# Altium footprint library 元件1.PcbLib: 420 footprints (part 12 of 27)
Each footprint in its own frame and in the unit in brackets; x right, y up, seen from the top. Pads: shape width x height; smd on the part's side, far side on the other; paste and mask are expansions set on the pad; w line width, h text height; cw(c..) or ccw(c..) is an arc to the next point about the centre after c.
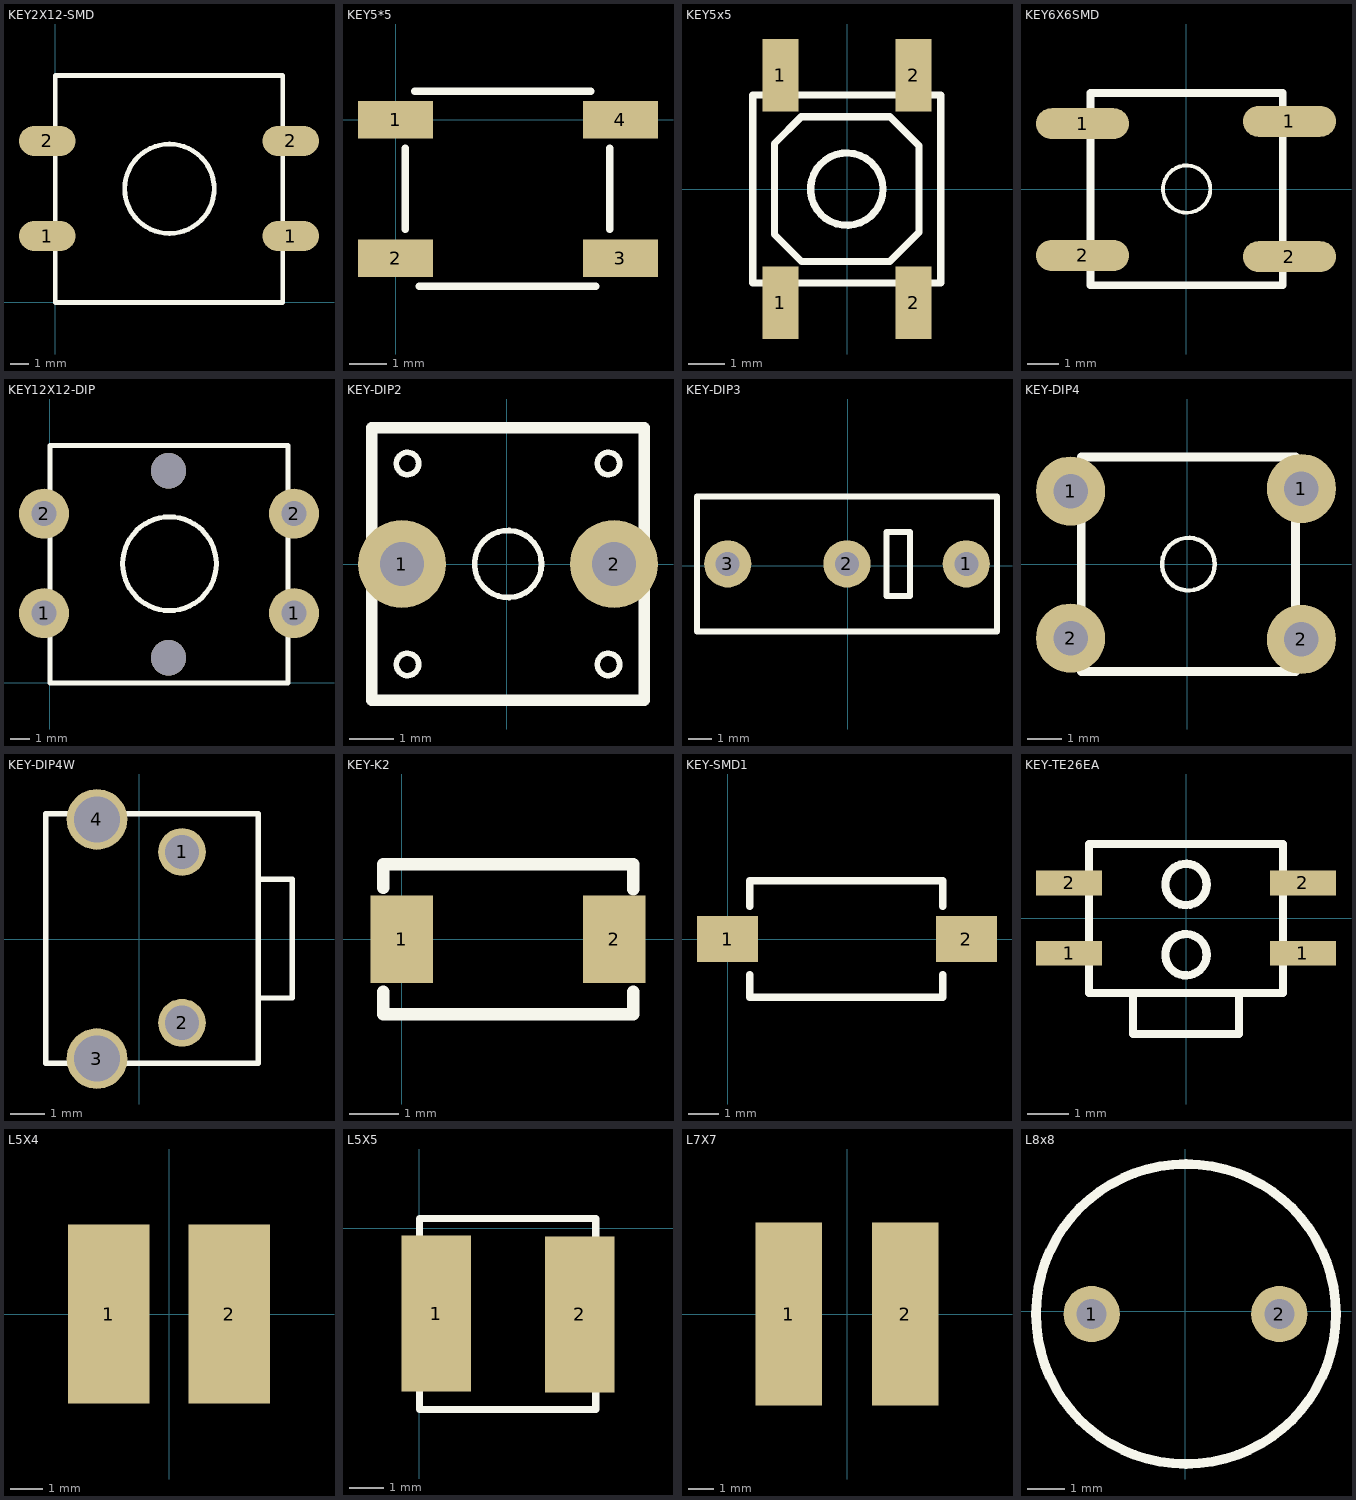
[diagram p11: the footprints below, top view; thin cyan lines are the x and y axes]

## KEY2X12-SMD [mm]
pads (4):
  oval 3x1.6 smd: 1(-0.43,3.532) 1(12.524,3.532) 2(-0.43,8.588) 2(12.524,8.588)
Top Overlay:
  circle w0.254: c6.071,6.045 r2.378
  lines w0.254: 0,0 12.09,0 12.09,12.065 0,12.065 0,0
3D body "User Library-SWT_12x12_SMD.step": height 4, standoff 0, extent -0.629,0.065 12.821,12.065

## KEY5*5 [mm]
pads (4):
  rect 2x1 smd: 1(0,0) 2(0,-3.7) 3(6,-3.7) 4(6,0)
Top Overlay:
  lines w0.2: 0.254,-2.921 0.254,-0.762 ; 0.508,0.762 5.207,0.762 ; 0.635,-4.445 5.334,-4.445 ; 5.715,-2.921 5.715,-0.762
3D body "User Library-IT-1187.STEP": height 1.5, standoff 0, extent -0.254,-4.454 6.146,0.746

## KEY5x5 [mm]
pads (4):
  rect 1x2 smd: 1(-1.841,-3.15) 1(-1.841,3.15) 2(1.841,-3.15) 2(1.841,3.15)
Top Overlay:
  circle w0.2: c-0.007,-0.003 r1
  lines w0.2: -2.607,-2.603 2.593,-2.603 2.593,2.597 -2.607,2.597 -2.607,-2.603 ; -2.007,-1.257 -2.007,1.257 -1.267,1.997 1.19,1.997 1.993,1.194 1.993,-1.194 1.185,-2.003 -1.261,-2.003 -2.007,-1.257
3D body: height 2.5, standoff 1.2, extent -0.992,-0.998 1,0.998
3D body: height 1.2, standoff 0, extent -2.6,-2.6 2.6,2.6

## KEY6X6SMD [mm]
pads (4):
  oval 3x1 smd: 1(-3.336,2.107) 1(3.336,2.181) 2(-3.336,-2.142) 2(3.336,-2.181)
Top Overlay:
  circle w0.127: c0.02,-0.005 r0.762
  lines w0.254: -3.079,-3.104 -3.079,3.094 3.119,3.094 3.119,-3.104 -3.079,-3.104
3D body "TACT SMD 6X6.step": height 5, standoff -0.05, extent -4.024,-3.025 4.126,2.975

## KEY12X12-DIP [mm]
pads (4):
  round 2.54 hole 1.27: 1(-0.303,3.532) 1(12.397,3.532) 2(-0.303,8.588) 2(12.397,8.588)
via 6.02,1.27 diameter 1.8 hole 1.8
via 6.02,10.77 diameter 1.8 hole 1.8
Top Overlay:
  circle w0.254: c6.071,6.045 r2.378
  lines w0.254: 0,0 0,12.065 12.09,12.065 12.09,0 0,0
3D body "SWT9-1.step": height 7.3, standoff -3.5, extent -0.455,0 12.545,12

## KEY-DIP2 [mm] "6X6"
pads (2):
  round 2 hole 1: 1(-2.379,0.004) 2(2.447,0.004)
Top Overlay:
  circle w0.127: c-2.252,-2.282 r0.254
  circle w0.127: c2.32,-2.282 r0.254
  circle w0.127: c2.32,2.29 r0.254
  circle w0.127: c-2.252,2.29 r0.254
  circle w0.127: c0.034,0.004 r0.762
  lines w0.254: -3.065,-3.095 -3.065,3.103 3.133,3.103 3.133,-3.095 -3.065,-3.095
3D body "SW6X6.stp": height 4.3, standoff -14, extent -2.949,-3.097 3.051,3.103

## KEY-DIP3 [mm]
pads (3):
  round 2 hole 1.016: 1(5.029,0.087) 3(-5.071,0.087)
  oval 2.007x2 hole 1.016: 2(-0.021,0.087)
Top Overlay:
  lines w0.254: -6.371,-2.773 6.329,-2.773 ; -6.371,-2.763 -6.371,2.937 6.329,2.937 6.329,-2.763 ; 1.649,-1.263 2.649,-1.263 2.649,1.437 1.649,1.437 1.649,-1.263
3D body "33308.stp": height 14.5, standoff -3.5, extent -6.375,-2.798 6.425,3.002

## KEY-DIP4 [mm] "6X6"
pads (4):
  round 2 hole 1: 1(-3.373,2.116) 1(3.299,2.189) 2(-3.373,-2.134) 2(3.299,-2.172)
Top Overlay:
  circle w0.127: c0.034,0.004 r0.762
  lines w0.254: -3.065,-3.095 3.133,-3.095 3.133,3.103 -3.065,3.103 -3.065,-3.095
3D body "4pin_TS-1143-WP.STEP": height 4.3, standoff -3.5, extent -4.125,-3.27 4.143,3.23

## KEY-DIP4W [mil]
pads (4):
  round 55 hole 39.37: 1(49,100.3) 2(49,-96.56)
  round 70 hole 53.15: 3(-49,-137.8) 4(-49,137.8)
Top Overlay:
  lines w6: 136.84,-68.06 176,-68.06 176,68.94 136.84,68.94 ; -108,-143.06 -108,144.35 136.84,144.35 136.84,-143.06 -108,-143.06
3D body "B3F_3100.STEP": height 137.8, standoff -291.34, extent -108.48,-166.84 173.02,175.68

## KEY-K2 [mil]
pads (2):
  rect 50x70 smd: 1(0,0) 2(170,0)
Top Overlay:
  lines w10: -15,-42 -15,-60 185,-60 185,-42 ; -15,41 -15,60 185,60 185,40
3D body "SW.STEP": height 78.74, standoff -3.94, extent -12.6,-58 182.6,60.11

## KEY-SMD1 [mm]
pads (2):
  rect 2x1.5 smd: 1(0,0) 2(7.8,0)
Top Overlay:
  lines w0.254: 0.725,-1.168 0.725,-1.9 7.025,-1.9 7.025,-1.168 ; 0.725,1.067 0.725,1.9 7.025,1.9 7.025,1.067
3D body "SMD按键.": height 2.5, standoff 0, extent -0.059,-1.945 7.831,1.905

## KEY-TE26EA [mm]
pads (4):
  rect 1.6x0.6 smd: 1(-2.832,-0.851) 1(2.832,-0.851) 2(-2.832,0.851) 2(2.832,0.851)
Top Overlay:
  circle w0.2: c0,0.813 r0.5
  circle w0.2: c0,-0.889 r0.5
  lines w0.2: -1.283,-1.836 -1.283,-2.807 1.283,-2.807 1.283,-1.836 ; -2.349,-1.816 -2.349,1.791 2.349,1.791 2.349,-1.816 -2.349,-1.816
3D body "零": height 1.63, standoff -0.02, extent -2.941,-2.807 2.959,1.693

## L5X4 [mm]
height 4.5
pads (2):
  rect 2.5x5.5 smd: 1(-1.85,0) 2(1.85,0)
3D body "电感.": height 4.5, standoff -0.01, extent -2.857,-2.6 2.857,2.6

## L5X5 [mm]
pads (2):
  rect 2x4.5 smd: 1(0.483,-2.464) 2(4.623,-2.489)
Top Overlay:
  lines w0.203: 0,-5.232 5.08,-5.232 5.08,0.279 0,0.279 0,-5.232
3D body "CDRH4D28.step": height 2.91, standoff 0, extent 0.065,-4.914 4.965,-0.014

## L7X7 [mm] "POWER INDUCTOR 5uH"
pads (2):
  rect 2.65x7.3 smd: 1(-2.325,0) 2(2.325,0)
3D body "SUMIDA-CDRH6D28.STEP": height 2.9, standoff 0, extent -3.36,-3.33 3.34,3.37

## L8x8 [mm] "L?"
pads (2):
  round 1.5 hole 0.8: 1(-2.489,-0.076) 2(2.515,-0.076)
Top Overlay:
  circle w0.254: c0.025,-0.076 r4
3D body "Inductor.step": height 11.2, standoff -5, extent -4.134,-4.236 4.166,4.064